# Altium footprint library 6-Connectors-6.PcbLib: 117 footprints (part 1 of 8)
Each footprint in its own frame and in the unit in brackets; x right, y up, seen from the top. Pads: shape width x height; smd on the part's side, far side on the other; paste and mask are expansions set on the pad; w line width, h text height; cw(c..) or ccw(c..) is an arc to the next point about the centre after c.
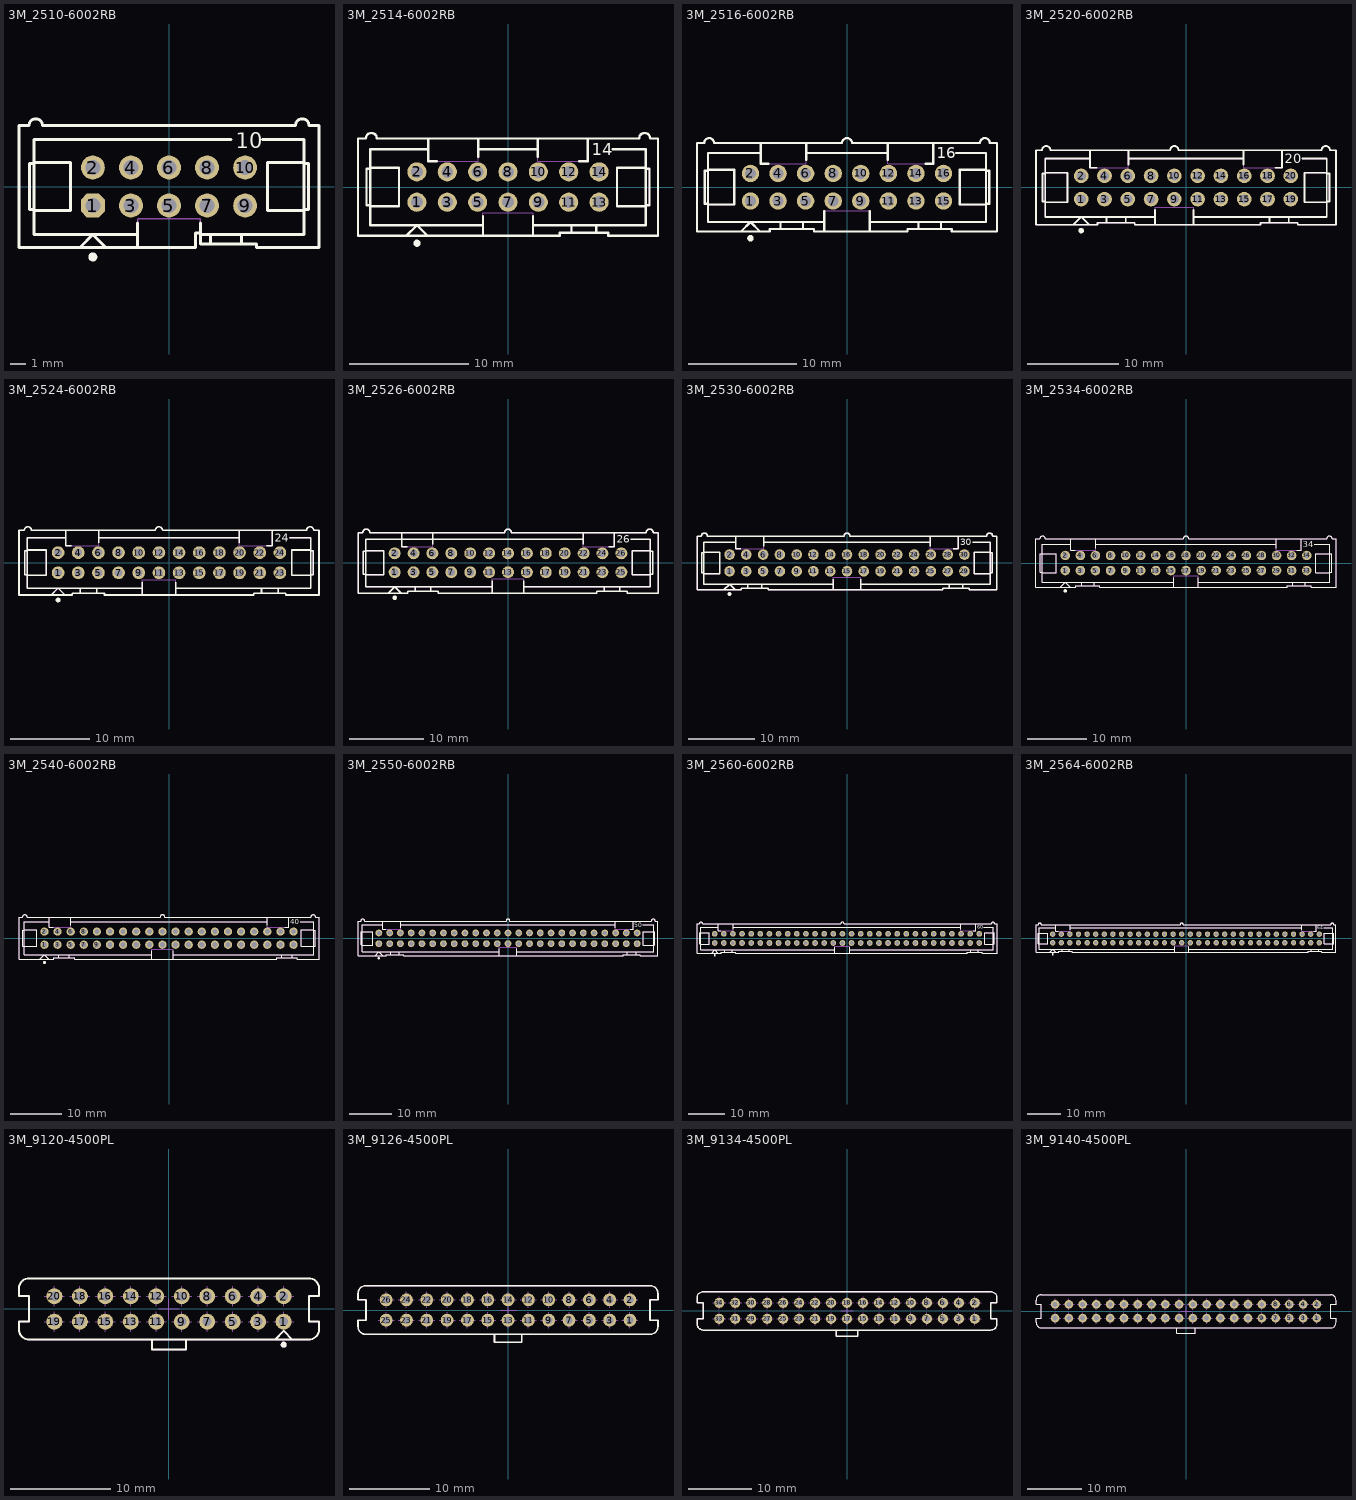
[diagram p0: the footprints below, top view; thin cyan lines are the x and y axes]

## 3M_2510-6002RB [mm] "10 Contacts - Straight .100\" x .100\" Low Profile Four-Wall Header"
height 10.03
pads (10):
  oct 1.6x1.6 hole 1: 1(-5.08,-1.27)
  round 1.6 hole 1: 2(-5.08,1.27) 3(-2.54,-1.27) 4(-2.54,1.27) 5(0,-1.27) 6(0,1.27) 7(2.54,-1.27) 8(2.54,1.27) 9(5.08,-1.27) 10(5.08,1.27)
Top Overlay:
  circle w0.3: c-5.08,-4.699 r0.15
  lines w0.2: -8.992,-1.603 -6.579,-1.603 -6.579,1.603 -8.992,1.603 ; -8.992,-1.524 -9.296,-1.524 -9.296,1.524 -8.992,1.524 ; -5.944,-4.064 -5.08,-3.2 -4.216,-4.064 ; -2.096,-4.064 -2.096,-2.438 ; -2.096,-3.2 -8.992,-3.2 -8.992,3.15 4.128,3.15 ; 2.095,-3.2 8.992,-3.2 8.992,3.15 6.223,3.15 ; 2.095,-3.102 1.778,-3.102 1.778,-4.064 -10.008,-4.064 -10.008,4.064 -9.347,4.064 cw(c-8.89,4.064) -8.433,4.064 8.433,4.064 cw(c8.89,4.064) 9.347,4.064 10.008,4.064 10.008,-4.064 5.842,-4.064 5.842,-3.835 2.095,-3.835 2.095,-2.438 ; 2.769,-3.835 2.769,-3.2 ; 4.851,-3.835 4.851,-3.2 ; 8.992,-1.603 6.579,-1.603 6.579,1.603 8.992,1.603 ; 8.992,-1.524 9.296,-1.524 9.296,1.524 8.992,1.524
  text "10" at 4.445,2.54 h1.02
Mechanical 14:
  lines w0.1: -8.992,-1.603 -6.579,-1.603 -6.579,1.603 -8.992,1.603 ; -8.992,-1.524 -9.296,-1.524 -9.296,1.524 -8.992,1.524 ; -5.944,-4.064 -5.08,-3.2 -4.216,-4.064 ; -2.096,-4.064 -2.096,-2.159 2.095,-2.159 2.095,-3.835 5.842,-3.835 5.842,-4.064 10.008,-4.064 10.008,4.064 9.347,4.064 ccw(c8.89,4.064) 8.433,4.064 -8.433,4.064 ccw(c-8.89,4.064) -9.347,4.064 -10.008,4.064 -10.008,-4.064 1.778,-4.064 1.778,-3.102 2.095,-3.102 ; -2.096,-3.2 -8.992,-3.2 -8.992,3.15 4.128,3.15 ; 2.095,-3.2 8.992,-3.2 8.992,3.15 6.223,3.15 ; 2.769,-3.835 2.769,-3.2 ; 4.851,-3.835 4.851,-3.2 ; 8.992,-1.603 6.579,-1.603 6.579,1.603 8.992,1.603 ; 8.992,-1.524 9.296,-1.524 9.296,1.524 8.992,1.524
  text "10" at 4.445,2.54 h1.02
3D body "3M_2510-6002RB.stp": height 9.65, standoff -2.59, extent -10.008,-4.064 10.008,4.572
3D body "m20-254via.stp": height 0.1, standoff -1.82, extent 4.23,0.42 5.93,2.12
3D body "m20-254via.stp": height 0.1, standoff -1.82, extent 4.23,-2.12 5.93,-0.42
3D body "m20-254via.stp": height 0.1, standoff -1.82, extent 1.69,-2.12 3.39,-0.42
3D body "m20-254via.stp": height 0.1, standoff -1.82, extent 1.69,0.42 3.39,2.12
3D body "m20-254via.stp": height 0.1, standoff -1.82, extent -0.85,0.42 0.85,2.12
3D body "m20-254via.stp": height 0.1, standoff -1.82, extent -0.85,-2.12 0.85,-0.42
3D body "m20-254via.stp": height 0.1, standoff -1.82, extent -3.39,-2.12 -1.69,-0.42
3D body "m20-254via.stp": height 0.1, standoff -1.82, extent -3.39,0.42 -1.69,2.12
3D body "m20-254via.stp": height 0.1, standoff -1.82, extent -5.93,0.42 -4.23,2.12
3D body "m20-254via.stp": height 0.1, standoff -1.82, extent -5.93,-2.12 -4.23,-0.42

## 3M_2514-6002RB [mm] "14 Contacts - Straight .100\" x .100\" Low Profile Four-Wall Header"
height 10.03
pads (14):
  round 1.6 hole 1: 1(-7.62,-1.27) 2(-7.62,1.27) 3(-5.08,-1.27) 4(-5.08,1.27) 5(-2.54,-1.27) 6(-2.54,1.27) 7(0,-1.27) 8(0,1.27) 9(2.54,-1.27) 10(2.54,1.27) 11(5.08,-1.27) 12(5.08,1.27) 13(7.62,-1.27) 14(7.62,1.27)
Top Overlay:
  circle w0.3: c-7.62,-4.699 r0.15
  lines w0.2: -11.532,-1.603 -9.119,-1.603 -9.119,1.603 -11.532,1.603 ; -11.532,-1.524 -11.836,-1.524 -11.836,1.524 -11.532,1.524 ; -8.484,-4.064 -7.62,-3.2 -6.756,-4.064 ; -6.668,3.15 -11.532,3.15 -11.532,-3.2 -2.096,-3.2 ; -6.668,4.064 -6.668,2.159 -5.959,2.159 ; -2.477,2.518 -2.477,4.064 ; -2.477,3.15 2.476,3.15 ; -2.096,-4.064 -2.096,-2.438 ; 2.095,-4.064 2.095,-2.438 ; 2.095,-3.2 11.532,-3.2 11.532,3.15 8.763,3.15 ; 2.476,2.518 2.476,4.064 ; 5.309,-3.835 5.309,-3.2 ; 5.959,2.159 6.668,2.159 6.668,4.064 ; 7.391,-3.835 7.391,-3.2 ; 11.532,-1.603 9.119,-1.603 9.119,1.603 11.532,1.603 ; 11.532,-1.524 11.836,-1.524 11.836,1.524 11.532,1.524 ; -12.548,-4.064 -12.548,4.064 -11.887,4.064 cw(c-11.43,4.064) -10.973,4.064 10.973,4.064 cw(c11.43,4.064) 11.887,4.064 12.548,4.064 12.548,-4.064 8.382,-4.064 8.382,-3.835 4.318,-3.835 4.318,-4.064 -12.548,-4.064
  text "14" at 6.985,2.667 h1.02
Mechanical 14:
  lines w0.1: -11.532,-1.603 -9.119,-1.603 -9.119,1.603 -11.532,1.603 ; -11.532,-1.524 -11.836,-1.524 -11.836,1.524 -11.532,1.524 ; -8.484,-4.064 -7.62,-3.2 -6.756,-4.064 ; -6.668,3.15 -11.532,3.15 -11.532,-3.2 -2.096,-3.2 ; -6.668,4.064 -6.668,2.159 -2.477,2.159 -2.477,4.064 ; -2.477,3.15 2.476,3.15 ; -2.096,-4.064 -2.096,-2.159 2.095,-2.159 2.095,-4.064 ; 2.095,-3.2 11.532,-3.2 11.532,3.15 8.763,3.15 ; 2.476,4.064 2.476,2.159 6.668,2.159 6.668,4.064 ; 5.309,-3.835 5.309,-3.2 ; 7.391,-3.835 7.391,-3.2 ; 11.532,-1.603 9.119,-1.603 9.119,1.603 11.532,1.603 ; 11.532,-1.524 11.836,-1.524 11.836,1.524 11.532,1.524 ; -12.548,-4.064 -12.548,4.064 -11.887,4.064 cw(c-11.43,4.064) -10.973,4.064 10.973,4.064 cw(c11.43,4.064) 11.887,4.064 12.548,4.064 12.548,-4.064 8.382,-4.064 8.382,-3.835 4.318,-3.835 4.318,-4.064 -12.548,-4.064
  text "14" at 6.985,2.667 h1.02
3D body "3M_2514-6002RB.stp": height 9.65, standoff -2.59, extent -12.548,-4.064 12.548,4.572

## 3M_2516-6002RB [mm] "16 Contacts - Straight .100\" x .100\" Low Profile Four-Wall Header"
height 10.03
pads (16):
  round 1.6 hole 1: 1(-8.89,-1.27) 2(-8.89,1.27) 3(-6.35,-1.27) 4(-6.35,1.27) 5(-3.81,-1.27) 6(-3.81,1.27) 7(-1.27,-1.27) 8(-1.27,1.27) 9(1.27,-1.27) 10(1.27,1.27) 11(3.81,-1.27) 12(3.81,1.27) 13(6.35,-1.27) 14(6.35,1.27) 15(8.89,-1.27) 16(8.89,1.27)
Top Overlay:
  circle w0.3: c-8.89,-4.699 r0.15
  lines w0.2: -12.802,-1.603 -10.389,-1.603 -10.389,1.603 -12.802,1.603 ; -12.802,-1.524 -13.106,-1.524 -13.106,1.524 -12.802,1.524 ; -9.754,-4.064 -8.89,-3.2 -8.026,-4.064 ; -7.938,3.15 -12.802,3.15 -12.802,-3.2 -2.096,-3.2 ; -7.938,4.064 -7.938,2.159 -7.229,2.159 ; -6.121,-3.835 -6.121,-3.2 ; -4.039,-3.835 -4.039,-3.2 ; -3.747,2.518 -3.747,4.064 ; -3.747,3.15 3.747,3.15 ; -2.096,-4.064 -2.096,-2.209 ; 2.095,-4.064 2.095,-2.209 ; 2.095,-3.2 12.802,-3.2 12.802,3.15 10.033,3.15 ; 3.747,2.518 3.747,4.064 ; 6.579,-3.835 6.579,-3.2 ; 7.229,2.159 7.938,2.159 7.938,4.064 ; 8.661,-3.835 8.661,-3.2 ; 12.802,-1.603 10.389,-1.603 10.389,1.603 12.802,1.603 ; 12.802,-1.524 13.106,-1.524 13.106,1.524 12.802,1.524 ; -13.818,-4.064 -13.818,4.064 -13.157,4.064 cw(c-12.7,4.064) -12.243,4.064 -0.457,4.064 cw(c0,4.064) 0.457,4.064 12.243,4.064 cw(c12.7,4.064) 13.157,4.064 13.818,4.064 13.818,-4.064 9.652,-4.064 9.652,-3.835 5.588,-3.835 5.588,-4.064 -3.048,-4.064 -3.048,-3.835 -7.112,-3.835 -7.112,-4.064 -13.818,-4.064
  text "16" at 8.255,2.667 h1.02
Mechanical 14:
  lines w0.1: -12.802,-1.603 -10.389,-1.603 -10.389,1.603 -12.802,1.603 ; -12.802,-1.524 -13.106,-1.524 -13.106,1.524 -12.802,1.524 ; -9.754,-4.064 -8.89,-3.2 -8.026,-4.064 ; -7.938,3.15 -12.802,3.15 -12.802,-3.2 -2.096,-3.2 ; -7.938,4.064 -7.938,2.159 -3.747,2.159 -3.747,4.064 ; -6.121,-3.835 -6.121,-3.2 ; -4.039,-3.835 -4.039,-3.2 ; -3.747,3.15 3.747,3.15 ; -2.096,-4.064 -2.096,-2.159 2.095,-2.159 2.095,-4.064 ; 2.095,-3.2 12.802,-3.2 12.802,3.15 10.033,3.15 ; 3.747,4.064 3.747,2.159 7.938,2.159 7.938,4.064 ; 6.579,-3.835 6.579,-3.2 ; 8.661,-3.835 8.661,-3.2 ; 12.802,-1.603 10.389,-1.603 10.389,1.603 12.802,1.603 ; 12.802,-1.524 13.106,-1.524 13.106,1.524 12.802,1.524 ; -13.818,-4.064 -13.818,4.064 -13.157,4.064 cw(c-12.7,4.064) -12.243,4.064 -0.457,4.064 cw(c0,4.064) 0.457,4.064 12.243,4.064 cw(c12.7,4.064) 13.157,4.064 13.818,4.064 13.818,-4.064 9.652,-4.064 9.652,-3.835 5.588,-3.835 5.588,-4.064 -3.048,-4.064 -3.048,-3.835 -7.112,-3.835 -7.112,-4.064 -13.818,-4.064
  text "16" at 8.255,2.667 h1.02
3D body "3M_2516-6002RB.stp": height 9.65, standoff -2.59, extent -13.818,-4.064 13.818,4.572

## 3M_2520-6002RB [mm] "20 Contacts - Straight .100\" x .100\" Low Profile Four-Wall Header"
height 10.03
pads (20):
  round 1.6 hole 1: 1(-11.43,-1.27) 2(-11.43,1.27) 3(-8.89,-1.27) 4(-8.89,1.27) 5(-6.35,-1.27) 6(-6.35,1.27) 7(-3.81,-1.27) 8(-3.81,1.27) 9(-1.27,-1.27) 10(-1.27,1.27) 11(1.27,-1.27) 12(1.27,1.27) 13(3.81,-1.27) 14(3.81,1.27) 15(6.35,-1.27) 16(6.35,1.27) 17(8.89,-1.27) 18(8.89,1.27) 19(11.43,-1.27) 20(11.43,1.27)
Top Overlay:
  circle w0.3: c-11.43,-4.699 r0.15
  lines w0.2: -15.342,-1.603 -12.929,-1.603 -12.929,1.603 -15.342,1.603 ; -15.342,-1.524 -15.646,-1.524 -15.646,1.524 -15.342,1.524 ; -12.294,-4.064 -11.43,-3.2 -10.566,-4.064 ; -10.478,3.15 -15.342,3.15 -15.342,-3.2 -3.366,-3.2 ; -10.478,4.064 -10.478,2.159 -9.769,2.159 ; -8.661,-3.835 -8.661,-3.2 ; -6.579,-3.835 -6.579,-3.2 ; -6.287,2.518 -6.287,4.064 ; -6.287,3.15 6.287,3.15 ; -3.366,-4.064 -3.366,-2.438 ; 0.826,-4.064 0.826,-2.438 ; 0.826,-3.2 15.342,-3.2 15.342,3.15 12.7,3.15 ; 6.287,2.518 6.287,4.064 ; 9.119,-3.835 9.119,-3.2 ; 9.769,2.159 10.478,2.159 10.478,4.064 ; 11.201,-3.835 11.201,-3.2 ; 15.342,-1.603 12.929,-1.603 12.929,1.603 15.342,1.603 ; 15.342,-1.524 15.646,-1.524 15.646,1.524 15.342,1.524 ; -16.358,-4.064 -9.652,-4.064 -9.652,-3.835 -5.588,-3.835 -5.588,-4.064 8.128,-4.064 8.128,-3.835 12.192,-3.835 12.192,-4.064 16.358,-4.064 16.358,4.064 15.697,4.064 ccw(c15.24,4.064) 14.783,4.064 -0.813,4.064 ccw(c-1.27,4.064) -1.727,4.064 -14.783,4.064 ccw(c-15.24,4.064) -15.697,4.064 -16.358,4.064 -16.358,-4.064
  text "20" at 10.795,2.667 h1.02
Mechanical 14:
  lines w0.1: -15.342,-1.603 -12.929,-1.603 -12.929,1.603 -15.342,1.603 ; -15.342,-1.524 -15.646,-1.524 -15.646,1.524 -15.342,1.524 ; -12.294,-4.064 -11.43,-3.2 -10.566,-4.064 ; -10.478,3.15 -15.342,3.15 -15.342,-3.2 -3.366,-3.2 ; -10.478,4.064 -10.478,2.159 -6.287,2.159 -6.287,4.064 ; -8.661,-3.835 -8.661,-3.2 ; -6.579,-3.835 -6.579,-3.2 ; -6.287,3.15 6.287,3.15 ; -3.366,-4.064 -3.366,-2.159 0.826,-2.159 0.826,-4.064 ; 0.826,-3.2 15.342,-3.2 15.342,3.15 12.7,3.15 ; 6.287,4.064 6.287,2.159 10.478,2.159 10.478,4.064 ; 9.119,-3.835 9.119,-3.2 ; 11.201,-3.835 11.201,-3.2 ; 15.342,-1.603 12.929,-1.603 12.929,1.603 15.342,1.603 ; 15.342,-1.524 15.646,-1.524 15.646,1.524 15.342,1.524 ; -16.358,-4.064 -9.652,-4.064 -9.652,-3.835 -5.588,-3.835 -5.588,-4.064 8.128,-4.064 8.128,-3.835 12.192,-3.835 12.192,-4.064 16.358,-4.064 16.358,4.064 15.697,4.064 ccw(c15.24,4.064) 14.783,4.064 -0.813,4.064 ccw(c-1.27,4.064) -1.727,4.064 -14.783,4.064 ccw(c-15.24,4.064) -15.697,4.064 -16.358,4.064 -16.358,-4.064
  text "20" at 10.795,2.667 h1.02
3D body "3M_2520-6002RB.stp": height 9.65, standoff -2.59, extent -16.358,-4.064 16.358,4.572

## 3M_2524-6002RB [mm] "24 Contacts - Straight .100\" x .100\" Low Profile Four-Wall Header"
height 10.03
pads (24):
  round 1.6 hole 1: 1(-13.97,-1.27) 2(-13.97,1.27) 3(-11.43,-1.27) 4(-11.43,1.27) 5(-8.89,-1.27) 6(-8.89,1.27) 7(-6.35,-1.27) 8(-6.35,1.27) 9(-3.81,-1.27) 10(-3.81,1.27) 11(-1.27,-1.27) 12(-1.27,1.27) 13(1.27,-1.27) 14(1.27,1.27) 15(3.81,-1.27) 16(3.81,1.27) 17(6.35,-1.27) 18(6.35,1.27) 19(8.89,-1.27) 20(8.89,1.27) 21(11.43,-1.27) 22(11.43,1.27) 23(13.97,-1.27) 24(13.97,1.27)
Top Overlay:
  circle w0.3: c-13.97,-4.699 r0.15
  lines w0.2: -17.882,-1.603 -15.469,-1.603 -15.469,1.603 -17.882,1.603 ; -17.882,-1.524 -18.186,-1.524 -18.186,1.524 -17.882,1.524 ; -14.834,-4.064 -13.97,-3.2 -13.106,-4.064 ; -13.018,3.15 -17.882,3.15 -17.882,-3.2 -3.366,-3.2 ; -13.018,4.064 -13.018,2.159 -12.309,2.159 ; -11.201,-3.835 -11.201,-3.2 ; -9.119,-3.835 -9.119,-3.2 ; -8.827,2.518 -8.827,4.064 ; -8.827,3.15 8.827,3.15 ; -3.366,-4.064 -3.366,-2.438 ; 0.826,-4.064 0.826,-2.438 ; 0.826,-3.2 17.882,-3.2 17.882,3.15 15.24,3.15 ; 8.827,2.518 8.827,4.064 ; 11.659,-3.835 11.659,-3.2 ; 12.309,2.159 13.018,2.159 13.018,4.064 ; 13.741,-3.835 13.741,-3.2 ; 17.882,-1.603 15.469,-1.603 15.469,1.603 17.882,1.603 ; 17.882,-1.524 18.186,-1.524 18.186,1.524 17.882,1.524 ; -18.898,-4.064 -12.192,-4.064 -12.192,-3.835 -8.128,-3.835 -8.128,-4.064 10.668,-4.064 10.668,-3.835 14.732,-3.835 14.732,-4.064 18.898,-4.064 18.898,4.064 18.237,4.064 ccw(c17.78,4.064) 17.323,4.064 -0.813,4.064 ccw(c-1.27,4.064) -1.727,4.064 -17.323,4.064 ccw(c-17.78,4.064) -18.237,4.064 -18.898,4.064 -18.898,-4.064
  text "24" at 13.335,2.667 h1.02
Mechanical 14:
  lines w0.1: -17.882,-1.603 -15.469,-1.603 -15.469,1.603 -17.882,1.603 ; -17.882,-1.524 -18.186,-1.524 -18.186,1.524 -17.882,1.524 ; -14.834,-4.064 -13.97,-3.2 -13.106,-4.064 ; -13.018,3.15 -17.882,3.15 -17.882,-3.2 -3.366,-3.2 ; -13.018,4.064 -13.018,2.159 -8.827,2.159 -8.827,4.064 ; -11.201,-3.835 -11.201,-3.2 ; -9.119,-3.835 -9.119,-3.2 ; -8.827,3.15 8.827,3.15 ; -3.366,-4.064 -3.366,-2.159 0.826,-2.159 0.826,-4.064 ; 0.826,-3.2 17.882,-3.2 17.882,3.15 15.24,3.15 ; 8.827,4.064 8.827,2.159 13.018,2.159 13.018,4.064 ; 11.659,-3.835 11.659,-3.2 ; 13.741,-3.835 13.741,-3.2 ; 17.882,-1.603 15.469,-1.603 15.469,1.603 17.882,1.603 ; 17.882,-1.524 18.186,-1.524 18.186,1.524 17.882,1.524 ; -18.898,-4.064 -12.192,-4.064 -12.192,-3.835 -8.128,-3.835 -8.128,-4.064 10.668,-4.064 10.668,-3.835 14.732,-3.835 14.732,-4.064 18.898,-4.064 18.898,4.064 18.237,4.064 ccw(c17.78,4.064) 17.323,4.064 -0.813,4.064 ccw(c-1.27,4.064) -1.727,4.064 -17.323,4.064 ccw(c-17.78,4.064) -18.237,4.064 -18.898,4.064 -18.898,-4.064
  text "24" at 13.335,2.667 h1.02
3D body "3M_2524-6002RB.stp": height 9.65, standoff -2.59, extent -18.898,-4.064 18.898,4.572

## 3M_2526-6002RB [mm] "26 Contacts - Straight .100\" x .100\" Low Profile Four-Wall Header"
height 10.03
pads (26):
  round 1.6 hole 1: 1(-15.24,-1.27) 2(-15.24,1.27) 3(-12.7,-1.27) 4(-12.7,1.27) 5(-10.16,-1.27) 6(-10.16,1.27) 7(-7.62,-1.27) 8(-7.62,1.27) 9(-5.08,-1.27) 10(-5.08,1.27) 11(-2.54,-1.27) 12(-2.54,1.27) 13(0,-1.27) 14(0,1.27) 15(2.54,-1.27) 16(2.54,1.27) 17(5.08,-1.27) 18(5.08,1.27) 19(7.62,-1.27) 20(7.62,1.27) 21(10.16,-1.27) 22(10.16,1.27) 23(12.7,-1.27) 24(12.7,1.27) 25(15.24,-1.27) 26(15.24,1.27)
Top Overlay:
  circle w0.3: c-15.24,-4.699 r0.15
  lines w0.2: -19.152,-1.603 -16.739,-1.603 -16.739,1.603 -19.152,1.603 ; -19.152,-1.524 -19.456,-1.524 -19.456,1.524 -19.152,1.524 ; -16.104,-4.064 -15.24,-3.2 -14.376,-4.064 ; -14.288,3.15 -19.152,3.15 ; -14.288,4.064 -14.288,2.159 -13.579,2.159 ; -12.471,-3.835 -12.471,-3.2 ; -10.389,-3.835 -10.389,-3.2 ; -10.097,2.518 -10.097,4.064 ; -2.096,-4.064 -2.096,-2.438 ; -2.096,-3.2 -19.152,-3.2 -19.152,3.15 ; 2.095,-4.064 2.095,-2.438 ; 2.095,-3.2 19.152,-3.2 19.152,3.15 16.51,3.15 ; 10.097,2.518 10.097,4.064 ; 10.097,3.15 -19.152,3.15 ; 12.929,-3.835 12.929,-3.2 ; 13.579,2.159 14.288,2.159 14.288,4.064 ; 15.011,-3.835 15.011,-3.2 ; 19.152,-1.603 16.739,-1.603 16.739,1.603 19.152,1.603 ; 19.152,-1.524 19.456,-1.524 19.456,1.524 19.152,1.524 ; -20.168,-4.064 -20.168,4.064 -19.507,4.064 cw(c-19.05,4.064) -18.593,4.064 -0.457,4.064 cw(c0,4.064) 0.457,4.064 18.593,4.064 cw(c19.05,4.064) 19.507,4.064 20.168,4.064 20.168,-4.064 16.002,-4.064 16.002,-3.835 11.938,-3.835 11.938,-4.064 -9.398,-4.064 -9.398,-3.835 -13.462,-3.835 -13.462,-4.064 -20.168,-4.064
  text "26" at 14.605,2.667 h1.02
Mechanical 14:
  lines w0.1: -19.152,-1.603 -16.739,-1.603 -16.739,1.603 -19.152,1.603 ; -19.152,-1.524 -19.456,-1.524 -19.456,1.524 -19.152,1.524 ; -16.104,-4.064 -15.24,-3.2 -14.376,-4.064 ; -14.288,3.15 -19.152,3.15 ; -14.288,4.064 -14.288,2.159 -10.097,2.159 -10.097,4.064 ; -12.471,-3.835 -12.471,-3.2 ; -10.389,-3.835 -10.389,-3.2 ; -2.096,-4.064 -2.096,-2.159 2.095,-2.159 2.095,-4.064 ; -2.096,-3.2 -19.152,-3.2 -19.152,3.15 ; 2.095,-3.2 19.152,-3.2 19.152,3.15 16.51,3.15 ; 10.097,3.15 -19.152,3.15 ; 10.097,4.064 10.097,2.159 14.288,2.159 14.288,4.064 ; 12.929,-3.835 12.929,-3.2 ; 15.011,-3.835 15.011,-3.2 ; 19.152,-1.603 16.739,-1.603 16.739,1.603 19.152,1.603 ; 19.152,-1.524 19.456,-1.524 19.456,1.524 19.152,1.524 ; -20.168,-4.064 -20.168,4.064 -19.507,4.064 cw(c-19.05,4.064) -18.593,4.064 -0.457,4.064 cw(c0,4.064) 0.457,4.064 18.593,4.064 cw(c19.05,4.064) 19.507,4.064 20.168,4.064 20.168,-4.064 16.002,-4.064 16.002,-3.835 11.938,-3.835 11.938,-4.064 -9.398,-4.064 -9.398,-3.835 -13.462,-3.835 -13.462,-4.064 -20.168,-4.064
  text "26" at 14.605,2.667 h1.02
3D body "3M_2526-6002RB.stp": height 9.65, standoff -2.59, extent -20.168,-4.064 20.168,4.572

## 3M_2530-6002RB [mm] "30 Contacts - Straight .100\" x .100\" Low Profile Four-Wall Header"
height 10.03
pads (30):
  round 1.6 hole 1: 1(-17.78,-1.27) 2(-17.78,1.27) 3(-15.24,-1.27) 4(-15.24,1.27) 5(-12.7,-1.27) 6(-12.7,1.27) 7(-10.16,-1.27) 8(-10.16,1.27) 9(-7.62,-1.27) 10(-7.62,1.27) 11(-5.08,-1.27) 12(-5.08,1.27) 13(-2.54,-1.27) 14(-2.54,1.27) 15(0,-1.27) 16(0,1.27) 17(2.54,-1.27) 18(2.54,1.27) 19(5.08,-1.27) 20(5.08,1.27) 21(7.62,-1.27) 22(7.62,1.27) 23(10.16,-1.27) 24(10.16,1.27) 25(12.7,-1.27) 26(12.7,1.27) 27(15.24,-1.27) 28(15.24,1.27) 29(17.78,-1.27) 30(17.78,1.27)
Top Overlay:
  circle w0.3: c-17.78,-4.699 r0.15
  lines w0.2: -21.692,-1.603 -19.279,-1.603 -19.279,1.603 -21.692,1.603 ; -21.692,-1.524 -21.996,-1.524 -21.996,1.524 -21.692,1.524 ; -18.644,-4.064 -17.78,-3.2 -16.916,-4.064 ; -16.828,3.15 -21.692,3.15 -21.692,-3.2 -2.096,-3.2 ; -16.828,4.064 -16.828,2.159 -16.119,2.159 ; -15.011,-3.835 -15.011,-3.2 ; -12.929,-3.835 -12.929,-3.2 ; -12.637,2.518 -12.637,4.064 ; -12.637,3.15 12.637,3.15 ; -2.096,-4.064 -2.096,-2.438 ; 2.095,-4.064 2.095,-2.438 ; 2.095,-3.2 21.692,-3.2 21.692,3.15 19.05,3.15 ; 12.637,2.518 12.637,4.064 ; 15.469,-3.835 15.469,-3.2 ; 16.119,2.159 16.828,2.159 16.828,4.064 ; 17.551,-3.835 17.551,-3.2 ; 21.692,-1.603 19.279,-1.603 19.279,1.603 21.692,1.603 ; 21.692,-1.524 21.996,-1.524 21.996,1.524 21.692,1.524 ; -22.708,-4.064 -22.708,4.064 -22.047,4.064 cw(c-21.59,4.064) -21.133,4.064 -0.457,4.064 cw(c0,4.064) 0.457,4.064 21.133,4.064 cw(c21.59,4.064) 22.047,4.064 22.708,4.064 22.708,-4.064 18.542,-4.064 18.542,-3.835 14.478,-3.835 14.478,-4.064 -11.938,-4.064 -11.938,-3.835 -16.002,-3.835 -16.002,-4.064 -22.708,-4.064
  text "30" at 17.145,2.667 h1.02
Mechanical 14:
  lines w0.1: -21.692,-1.603 -19.279,-1.603 -19.279,1.603 -21.692,1.603 ; -21.692,-1.524 -21.996,-1.524 -21.996,1.524 -21.692,1.524 ; -18.644,-4.064 -17.78,-3.2 -16.916,-4.064 ; -16.828,3.15 -21.692,3.15 -21.692,-3.2 -2.096,-3.2 ; -16.828,4.064 -16.828,2.159 -12.637,2.159 -12.637,4.064 ; -15.011,-3.835 -15.011,-3.2 ; -12.929,-3.835 -12.929,-3.2 ; -12.637,3.15 12.637,3.15 ; -2.096,-4.064 -2.096,-2.159 2.095,-2.159 2.095,-4.064 ; 2.095,-3.2 21.692,-3.2 21.692,3.15 19.05,3.15 ; 12.637,4.064 12.637,2.159 16.828,2.159 16.828,4.064 ; 15.469,-3.835 15.469,-3.2 ; 17.551,-3.835 17.551,-3.2 ; 21.692,-1.603 19.279,-1.603 19.279,1.603 21.692,1.603 ; 21.692,-1.524 21.996,-1.524 21.996,1.524 21.692,1.524 ; -22.708,-4.064 -22.708,4.064 -22.047,4.064 cw(c-21.59,4.064) -21.133,4.064 -0.457,4.064 cw(c0,4.064) 0.457,4.064 21.133,4.064 cw(c21.59,4.064) 22.047,4.064 22.708,4.064 22.708,-4.064 18.542,-4.064 18.542,-3.835 14.478,-3.835 14.478,-4.064 -11.938,-4.064 -11.938,-3.835 -16.002,-3.835 -16.002,-4.064 -22.708,-4.064
  text "30" at 17.145,2.667 h1.02
3D body "3M_2530-6002RB.stp": height 9.65, standoff -2.59, extent -22.708,-4.064 22.708,4.572

## 3M_2534-6002RB [mm] "34 Contacts - Straight .100\" x .100\" Low Profile Four-Wall Header"
height 10.03
pads (34):
  round 1.6 hole 1: 1(-20.32,-1.27) 2(-20.32,1.27) 3(-17.78,-1.27) 4(-17.78,1.27) 5(-15.24,-1.27) 6(-15.24,1.27) 7(-12.7,-1.27) 8(-12.7,1.27) 9(-10.16,-1.27) 10(-10.16,1.27) 11(-7.62,-1.27) 12(-7.62,1.27) 13(-5.08,-1.27) 14(-5.08,1.27) 15(-2.54,-1.27) 16(-2.54,1.27) 17(0,-1.27) 18(0,1.27) 19(2.54,-1.27) 20(2.54,1.27) 21(5.08,-1.27) 22(5.08,1.27) 23(7.62,-1.27) 24(7.62,1.27) 25(10.16,-1.27) 26(10.16,1.27) 27(12.7,-1.27) 28(12.7,1.27) 29(15.24,-1.27) 30(15.24,1.27) 31(17.78,-1.27) 32(17.78,1.27) 33(20.32,-1.27) 34(20.32,1.27)
Top Overlay:
  circle w0.3: c-20.32,-4.699 r0.15
  lines w0.2: -24.232,-1.603 -21.819,-1.603 -21.819,1.603 -24.232,1.603 ; -24.232,-1.524 -24.536,-1.524 -24.536,1.524 -24.232,1.524 ; -21.184,-4.064 -20.32,-3.2 -19.456,-4.064 ; -19.368,3.15 -24.232,3.15 -24.232,-3.2 -2.096,-3.2 ; -19.368,4.064 -19.368,2.159 -18.659,2.159 ; -17.551,-3.835 -17.551,-3.2 ; -15.469,-3.835 -15.469,-3.2 ; -15.177,2.518 -15.177,4.064 ; -15.177,3.15 15.177,3.15 ; -2.096,-4.064 -2.096,-2.438 ; 2.095,-4.064 2.095,-2.438 ; 2.095,-3.2 24.232,-3.2 24.232,3.15 21.59,3.15 ; 15.177,2.518 15.177,4.064 ; 18.009,-3.835 18.009,-3.2 ; 18.659,2.159 19.368,2.159 19.368,4.064 ; 20.091,-3.835 20.091,-3.2 ; 24.232,-1.603 21.819,-1.603 21.819,1.603 24.232,1.603 ; 24.232,-1.524 24.536,-1.524 24.536,1.524 24.232,1.524 ; -25.248,-4.064 -25.248,4.064 -24.587,4.064 cw(c-24.13,4.064) -23.673,4.064 -0.457,4.064 cw(c0,4.064) 0.457,4.064 23.673,4.064 cw(c24.13,4.064) 24.587,4.064 25.248,4.064 25.248,-4.064 21.082,-4.064 21.082,-3.835 17.018,-3.835 17.018,-4.064 -14.478,-4.064 -14.478,-3.835 -18.542,-3.835 -18.542,-4.064 -25.248,-4.064
  text "34" at 19.685,2.667 h1.02
Mechanical 14:
  lines w0.1: -24.232,-1.603 -21.819,-1.603 -21.819,1.603 -24.232,1.603 ; -24.232,-1.524 -24.536,-1.524 -24.536,1.524 -24.232,1.524 ; -21.184,-4.064 -20.32,-3.2 -19.456,-4.064 ; -19.368,3.15 -24.232,3.15 -24.232,-3.2 -2.096,-3.2 ; -19.368,4.064 -19.368,2.159 -15.177,2.159 -15.177,4.064 ; -17.551,-3.835 -17.551,-3.2 ; -15.469,-3.835 -15.469,-3.2 ; -15.177,3.15 15.177,3.15 ; -2.096,-4.064 -2.096,-2.159 2.095,-2.159 2.095,-4.064 ; 2.095,-3.2 24.232,-3.2 24.232,3.15 21.59,3.15 ; 15.177,4.064 15.177,2.159 19.368,2.159 19.368,4.064 ; 18.009,-3.835 18.009,-3.2 ; 20.091,-3.835 20.091,-3.2 ; 24.232,-1.603 21.819,-1.603 21.819,1.603 24.232,1.603 ; 24.232,-1.524 24.536,-1.524 24.536,1.524 24.232,1.524 ; -25.248,-4.064 -25.248,4.064 -24.587,4.064 cw(c-24.13,4.064) -23.673,4.064 -0.457,4.064 cw(c0,4.064) 0.457,4.064 23.673,4.064 cw(c24.13,4.064) 24.587,4.064 25.248,4.064 25.248,-4.064 21.082,-4.064 21.082,-3.835 17.018,-3.835 17.018,-4.064 -14.478,-4.064 -14.478,-3.835 -18.542,-3.835 -18.542,-4.064 -25.248,-4.064
  text "34" at 19.685,2.667 h1.02
3D body "3M_2534-6002RB.stp": height 9.65, standoff -2.59, extent -25.248,-4.064 25.248,4.572
